# Altium integrated library Samtec 2 mm Pitch Terminal Strips.IntLib: 623 symbols (part 2 of 5)
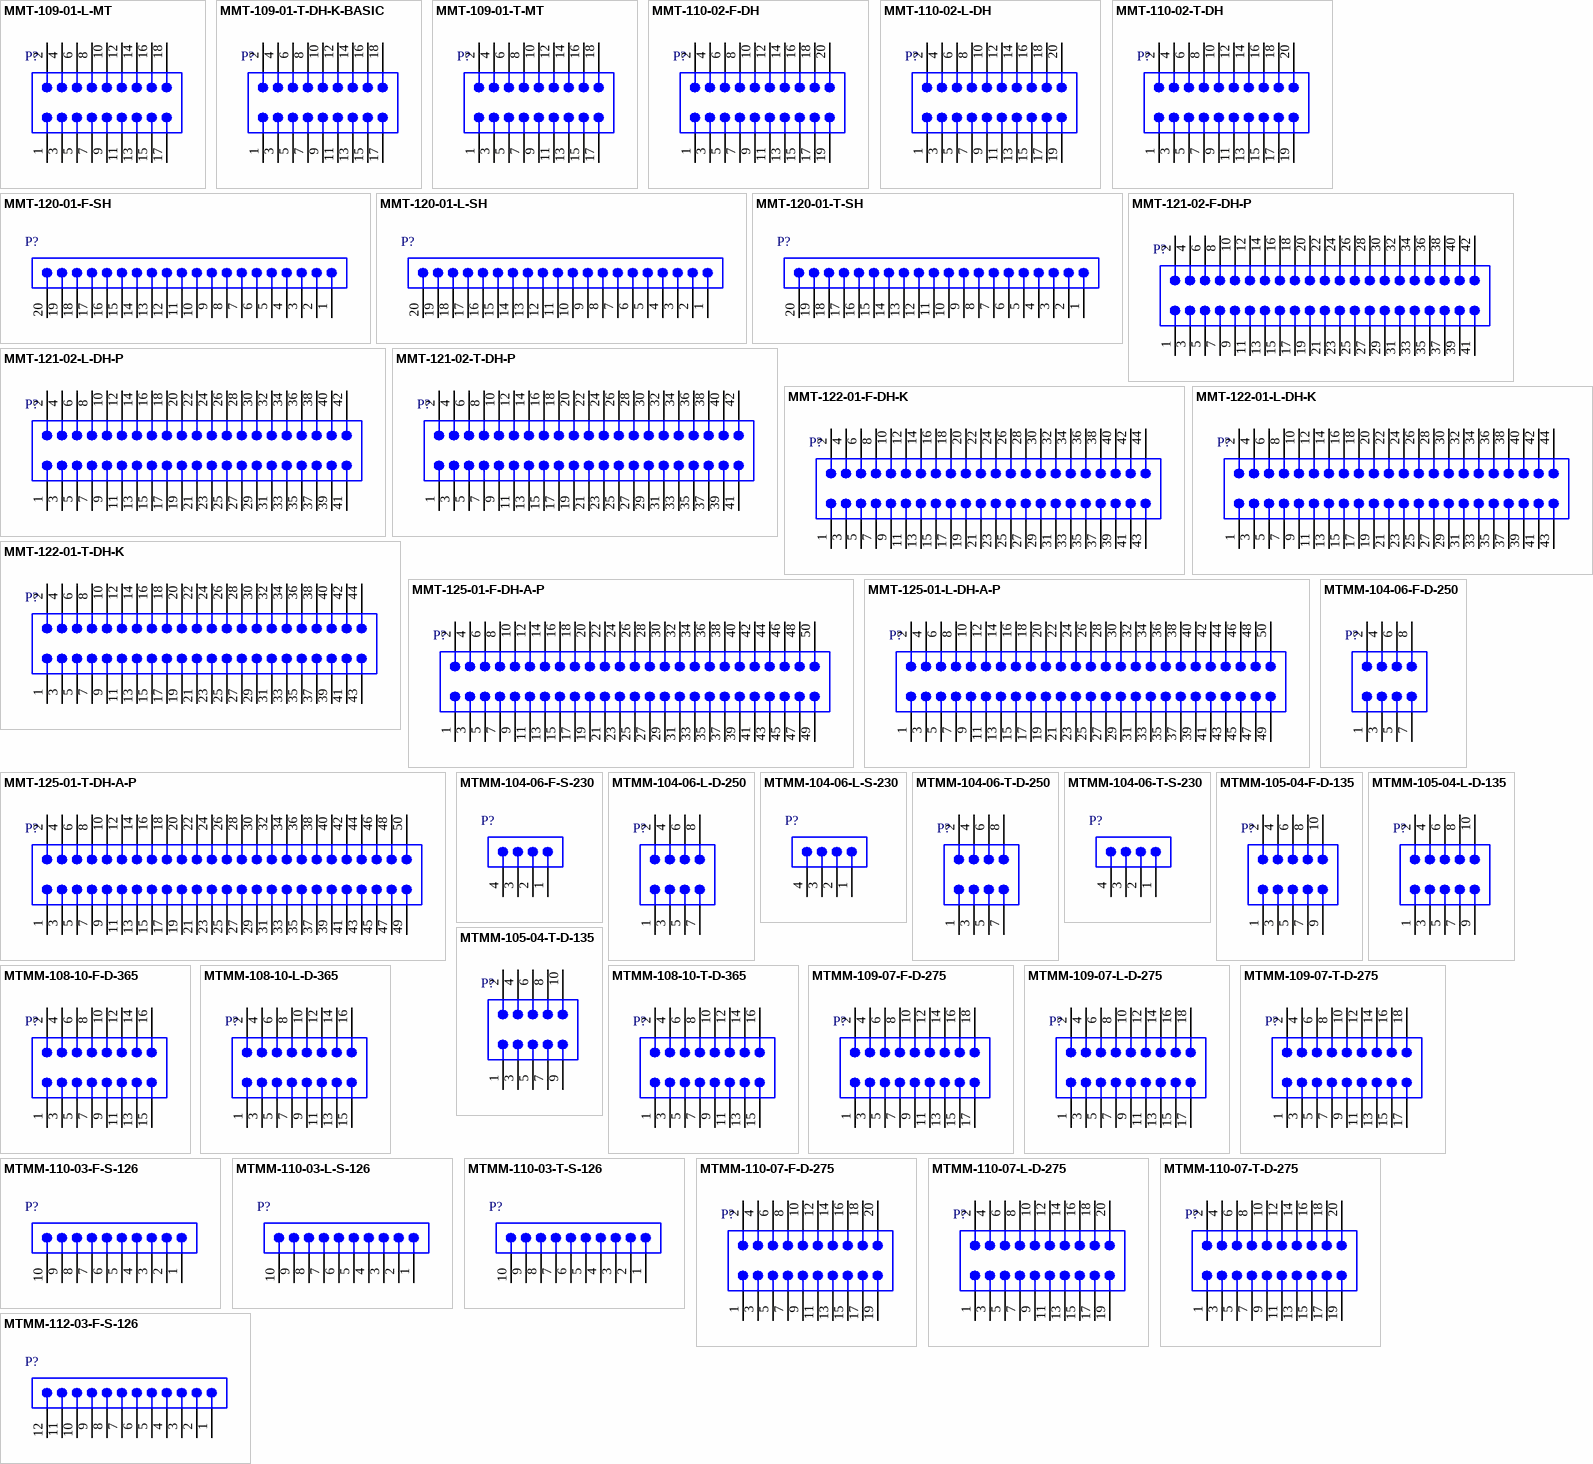
[diagram p18: symbols MMT-109-01-L-MT to MTMM-112-03-F-S-126]

## MMT-125-01-T-DH-A-P
designator P?
Horizontal Surface Mount Header, -55 to 105 degC, 2 mm Pitch, 50-Pin, Male, RoHS; Manufacturer: Samtec; PartNumber: MMT-125-01-T-DH-A-P; Pitch: 2 mm; DatasheetVersion: F-214; PackageVersion: CY, 12/2000; PackageReference: MMT-125-01-X-DH-A-P; PackageDescription: 2mm Horizontal Terminal Surface Mount Strip ASSEM; Orientation: Horizontal; RoHS: True; Temperature Range: -55 to 105 degC; Mounting Technology: Surface Mount; ComponentLink1Description: Manufacturer URL; ComponentLink1URL: http://www.samtec.com; ComponentLink2Description: Datasheet; ComponentLink2URL: http://d2a072wq521u33.cloudfront.net/catalog_english//MMT_SM.PDF; ComponentLink3Description: Package Specification; ComponentLink3URL: http://www.samtec.com/documents/webfiles/cpdf/MMT-1XX-XX-XX-XX-XX-XXX-X-XX-MKT.pdf
footprint SMTC-MMT-125-01-X-DH-A-P (Terminal Surface Mount Strip ASSEM, 2x25 Pins, Horizontal, 2mm Pitch, Male)
pins: 1, 2, 3, 4, 5, 6, 7, 8, 9, 10, 11, 12, 13, 14, 15, 16, 17, 18, 19, 20, 21, 22, 23, 24, 25, 26, 27, 28, 29, 30, 31, 32, 33, 34, 35, 36, 37, 38, 39, 40, 41, 42, 43, 44, 45, 46, 47, 48, 49, 50

## MTMM-104-06-F-D-250
designator P?
Modified Through-Hole Header, Vertical, -55 to 125 degC, 2 mm Pitch, 8-Pin, Male, RoHS; Manufacturer: Samtec; PartNumber: MTMM-104-06-F-D-250; Pitch: 2 mm; DatasheetVersion: F-214; PackageVersion: AE, 12/1993; PackageReference: MTMM-104-06-X-D-250; PackageDescription: 2mm Terminal Strip Assembly; Orientation: Vertical; RoHS: True; Temperature Range: -55 to 125 degC; Mounting Technology: Through-hole; ComponentLink1Description: Manufacturer URL; ComponentLink1URL: http://www.samtec.com; ComponentLink2Description: Datasheet; ComponentLink2URL: http://d2a072wq521u33.cloudfront.net/catalog_english//MTMM_TH.PDF; ComponentLink3Description: Package Specification; ComponentLink3URL: http://www.samtec.com/documents/webfiles/cpdf/MTMM-1XX-XX-XX-X-XXX-XX-XXX-MKT.pdf
footprint SMTC-MTMM-104-06-X-D-250 (Terminal Strip Assembly, 2x4 Pins, Vertical, 2mm Pitch, Male)
pins: 1, 2, 3, 4, 5, 6, 7, 8

## MTMM-104-06-F-S-230
designator P?
Modified Through-Hole Header, Vertical, -55 to 125 degC, 2 mm Pitch, 4-Pin, Male, RoHS; Manufacturer: Samtec; PartNumber: MTMM-104-06-F-S-230; Pitch: 2 mm; DatasheetVersion: F-214; PackageVersion: AE, 12/1993; PackageReference: MTMM-104-06-X-S-230; PackageDescription: 2mm Terminal Strip Assembly; Orientation: Vertical; RoHS: True; Temperature Range: -55 to 125 degC; Mounting Technology: Through-hole; ComponentLink1Description: Manufacturer URL; ComponentLink1URL: http://www.samtec.com; ComponentLink2Description: Datasheet; ComponentLink2URL: http://d2a072wq521u33.cloudfront.net/catalog_english//MTMM_TH.PDF; ComponentLink3Description: Package Specification; ComponentLink3URL: http://www.samtec.com/documents/webfiles/cpdf/MTMM-1XX-XX-XX-X-XXX-XX-XXX-MKT.pdf
footprint SMTC-MTMM-104-06-X-S-230 (Terminal Strip Assembly, 1x4 Pins, Vertical, 2mm Pitch, Male)
pins: 1, 2, 3, 4

## MTMM-104-06-L-D-250
designator P?
Modified Through-Hole Header, Vertical, -55 to 125 degC, 2 mm Pitch, 8-Pin, Male, RoHS; Manufacturer: Samtec; PartNumber: MTMM-104-06-L-D-250; Pitch: 2 mm; DatasheetVersion: F-214; PackageVersion: AE, 12/1993; PackageReference: MTMM-104-06-X-D-250; PackageDescription: 2mm Terminal Strip Assembly; Orientation: Vertical; RoHS: True; Temperature Range: -55 to 125 degC; Mounting Technology: Through-hole; ComponentLink1Description: Manufacturer URL; ComponentLink1URL: http://www.samtec.com; ComponentLink2Description: Datasheet; ComponentLink2URL: http://d2a072wq521u33.cloudfront.net/catalog_english//MTMM_TH.PDF; ComponentLink3Description: Package Specification; ComponentLink3URL: http://www.samtec.com/documents/webfiles/cpdf/MTMM-1XX-XX-XX-X-XXX-XX-XXX-MKT.pdf
footprint SMTC-MTMM-104-06-X-D-250 (Terminal Strip Assembly, 2x4 Pins, Vertical, 2mm Pitch, Male)
pins: 1, 2, 3, 4, 5, 6, 7, 8

## MTMM-104-06-L-S-230
designator P?
Modified Through-Hole Header, Vertical, -55 to 125 degC, 2 mm Pitch, 4-Pin, Male, RoHS; Manufacturer: Samtec; PartNumber: MTMM-104-06-L-S-230; Pitch: 2 mm; DatasheetVersion: F-214; PackageVersion: AE, 12/1993; PackageReference: MTMM-104-06-X-S-230; PackageDescription: 2mm Terminal Strip Assembly; Orientation: Vertical; RoHS: True; Temperature Range: -55 to 125 degC; Mounting Technology: Through-hole; ComponentLink1Description: Manufacturer URL; ComponentLink1URL: http://www.samtec.com; ComponentLink2Description: Datasheet; ComponentLink2URL: http://d2a072wq521u33.cloudfront.net/catalog_english//MTMM_TH.PDF; ComponentLink3Description: Package Specification; ComponentLink3URL: http://www.samtec.com/documents/webfiles/cpdf/MTMM-1XX-XX-XX-X-XXX-XX-XXX-MKT.pdf
footprint SMTC-MTMM-104-06-X-S-230 (Terminal Strip Assembly, 1x4 Pins, Vertical, 2mm Pitch, Male)
pins: 1, 2, 3, 4

## MTMM-104-06-T-D-250
designator P?
Modified Through-Hole Header, Vertical, -55 to 105 degC, 2 mm Pitch, 8-Pin, Male, RoHS; Manufacturer: Samtec; PartNumber: MTMM-104-06-T-D-250; Pitch: 2 mm; DatasheetVersion: F-214; PackageVersion: AE, 12/1993; PackageReference: MTMM-104-06-X-D-250; PackageDescription: 2mm Terminal Strip Assembly; Orientation: Vertical; RoHS: True; Temperature Range: -55 to 105 degC; Mounting Technology: Through-hole; ComponentLink1Description: Manufacturer URL; ComponentLink1URL: http://www.samtec.com; ComponentLink2Description: Datasheet; ComponentLink2URL: http://d2a072wq521u33.cloudfront.net/catalog_english//MTMM_TH.PDF; ComponentLink3Description: Package Specification; ComponentLink3URL: http://www.samtec.com/documents/webfiles/cpdf/MTMM-1XX-XX-XX-X-XXX-XX-XXX-MKT.pdf
footprint SMTC-MTMM-104-06-X-D-250 (Terminal Strip Assembly, 2x4 Pins, Vertical, 2mm Pitch, Male)
pins: 1, 2, 3, 4, 5, 6, 7, 8

## MTMM-104-06-T-S-230
designator P?
Modified Through-Hole Header, Vertical, -55 to 105 degC, 2 mm Pitch, 4-Pin, Male, RoHS; Manufacturer: Samtec; PartNumber: MTMM-104-06-T-S-230; Pitch: 2 mm; DatasheetVersion: F-214; PackageVersion: AE, 12/1993; PackageReference: MTMM-104-06-X-S-230; PackageDescription: 2mm Terminal Strip Assembly; Orientation: Vertical; RoHS: True; Temperature Range: -55 to 105 degC; Mounting Technology: Through-hole; ComponentLink1Description: Manufacturer URL; ComponentLink1URL: http://www.samtec.com; ComponentLink2Description: Datasheet; ComponentLink2URL: http://d2a072wq521u33.cloudfront.net/catalog_english//MTMM_TH.PDF; ComponentLink3Description: Package Specification; ComponentLink3URL: http://www.samtec.com/documents/webfiles/cpdf/MTMM-1XX-XX-XX-X-XXX-XX-XXX-MKT.pdf
footprint SMTC-MTMM-104-06-X-S-230 (Terminal Strip Assembly, 1x4 Pins, Vertical, 2mm Pitch, Male)
pins: 1, 2, 3, 4

## MTMM-105-04-F-D-135
designator P?
Modified Through-Hole Header, Vertical, -55 to 125 degC, 2 mm Pitch, 10-Pin, Male, RoHS; Manufacturer: Samtec; PartNumber: MTMM-105-04-F-D-135; Pitch: 2 mm; DatasheetVersion: F-214; PackageVersion: AE, 12/1993; PackageReference: MTMM-105-04-X-D-135; PackageDescription: 2mm Terminal Strip Assembly; Orientation: Vertical; RoHS: True; Temperature Range: -55 to 125 degC; Mounting Technology: Through-hole; ComponentLink1Description: Manufacturer URL; ComponentLink1URL: http://www.samtec.com; ComponentLink2Description: Datasheet; ComponentLink2URL: http://d2a072wq521u33.cloudfront.net/catalog_english//MTMM_TH.PDF; ComponentLink3Description: Package Specification; ComponentLink3URL: http://www.samtec.com/documents/webfiles/cpdf/MTMM-1XX-XX-XX-X-XXX-XX-XXX-MKT.pdf
footprint SMTC-MTMM-105-04-X-D-135 (Terminal Strip Assembly, 2x5 Pins, Vertical, 2mm Pitch, Male)
pins: 1, 2, 3, 4, 5, 6, 7, 8, 9, 10

## MTMM-105-04-L-D-135
designator P?
Modified Through-Hole Header, Vertical, -55 to 125 degC, 2 mm Pitch, 10-Pin, Male, RoHS; Manufacturer: Samtec; PartNumber: MTMM-105-04-L-D-135; Pitch: 2 mm; DatasheetVersion: F-214; PackageVersion: AE, 12/1993; PackageReference: MTMM-105-04-X-D-135; PackageDescription: 2mm Terminal Strip Assembly; Orientation: Vertical; RoHS: True; Temperature Range: -55 to 125 degC; Mounting Technology: Through-hole; ComponentLink1Description: Manufacturer URL; ComponentLink1URL: http://www.samtec.com; ComponentLink2Description: Datasheet; ComponentLink2URL: http://d2a072wq521u33.cloudfront.net/catalog_english//MTMM_TH.PDF; ComponentLink3Description: Package Specification; ComponentLink3URL: http://www.samtec.com/documents/webfiles/cpdf/MTMM-1XX-XX-XX-X-XXX-XX-XXX-MKT.pdf
footprint SMTC-MTMM-105-04-X-D-135 (Terminal Strip Assembly, 2x5 Pins, Vertical, 2mm Pitch, Male)
pins: 1, 2, 3, 4, 5, 6, 7, 8, 9, 10

## MTMM-105-04-T-D-135
designator P?
Modified Through-Hole Header, Vertical, -55 to 105 degC, 2 mm Pitch, 10-Pin, Male, RoHS; Manufacturer: Samtec; PartNumber: MTMM-105-04-T-D-135; Pitch: 2 mm; DatasheetVersion: F-214; PackageVersion: AE, 12/1993; PackageReference: MTMM-105-04-X-D-135; PackageDescription: 2mm Terminal Strip Assembly; Orientation: Vertical; RoHS: True; Temperature Range: -55 to 105 degC; Mounting Technology: Through-hole; ComponentLink1Description: Manufacturer URL; ComponentLink1URL: http://www.samtec.com; ComponentLink2Description: Datasheet; ComponentLink2URL: http://d2a072wq521u33.cloudfront.net/catalog_english//MTMM_TH.PDF; ComponentLink3Description: Package Specification; ComponentLink3URL: http://www.samtec.com/documents/webfiles/cpdf/MTMM-1XX-XX-XX-X-XXX-XX-XXX-MKT.pdf
footprint SMTC-MTMM-105-04-X-D-135 (Terminal Strip Assembly, 2x5 Pins, Vertical, 2mm Pitch, Male)
pins: 1, 2, 3, 4, 5, 6, 7, 8, 9, 10

## MTMM-108-10-F-D-365
designator P?
Modified Through-Hole Header, Vertical, -55 to 125 degC, 2 mm Pitch, 16-Pin, Male, RoHS; Manufacturer: Samtec; PartNumber: MTMM-108-10-F-D-365; Pitch: 2 mm; DatasheetVersion: F-214; PackageVersion: AE, 12/1993; PackageReference: MTMM-108-10-X-D-365; PackageDescription: 2mm Terminal Strip Assembly; Orientation: Vertical; RoHS: True; Temperature Range: -55 to 125 degC; Mounting Technology: Through-hole; ComponentLink1Description: Manufacturer URL; ComponentLink1URL: http://www.samtec.com; ComponentLink2Description: Datasheet; ComponentLink2URL: http://d2a072wq521u33.cloudfront.net/catalog_english//MTMM_TH.PDF; ComponentLink3Description: Package Specification; ComponentLink3URL: http://www.samtec.com/documents/webfiles/cpdf/MTMM-1XX-XX-XX-X-XXX-XX-XXX-MKT.pdf
footprint SMTC-MTMM-108-10-X-D-365 (Terminal Strip Assembly, 2x8 Pins, Vertical, 2mm Pitch, Male)
pins: 1, 2, 3, 4, 5, 6, 7, 8, 9, 10, 11, 12, 13, 14, 15, 16

## MTMM-108-10-L-D-365
designator P?
Modified Through-Hole Header, Vertical, -55 to 125 degC, 2 mm Pitch, 16-Pin, Male, RoHS; Manufacturer: Samtec; PartNumber: MTMM-108-10-L-D-365; Pitch: 2 mm; DatasheetVersion: F-214; PackageVersion: AE, 12/1993; PackageReference: MTMM-108-10-X-D-365; PackageDescription: 2mm Terminal Strip Assembly; Orientation: Vertical; RoHS: True; Temperature Range: -55 to 125 degC; Mounting Technology: Through-hole; ComponentLink1Description: Manufacturer URL; ComponentLink1URL: http://www.samtec.com; ComponentLink2Description: Datasheet; ComponentLink2URL: http://d2a072wq521u33.cloudfront.net/catalog_english//MTMM_TH.PDF; ComponentLink3Description: Package Specification; ComponentLink3URL: http://www.samtec.com/documents/webfiles/cpdf/MTMM-1XX-XX-XX-X-XXX-XX-XXX-MKT.pdf
footprint SMTC-MTMM-108-10-X-D-365 (Terminal Strip Assembly, 2x8 Pins, Vertical, 2mm Pitch, Male)
pins: 1, 2, 3, 4, 5, 6, 7, 8, 9, 10, 11, 12, 13, 14, 15, 16

## MTMM-108-10-T-D-365
designator P?
Modified Through-Hole Header, Vertical, -55 to 105 degC, 2 mm Pitch, 16-Pin, Male, RoHS; Manufacturer: Samtec; PartNumber: MTMM-108-10-T-D-365; Pitch: 2 mm; DatasheetVersion: F-214; PackageVersion: AE, 12/1993; PackageReference: MTMM-108-10-X-D-365; PackageDescription: 2mm Terminal Strip Assembly; Orientation: Vertical; RoHS: True; Temperature Range: -55 to 105 degC; Mounting Technology: Through-hole; ComponentLink1Description: Manufacturer URL; ComponentLink1URL: http://www.samtec.com; ComponentLink2Description: Datasheet; ComponentLink2URL: http://d2a072wq521u33.cloudfront.net/catalog_english//MTMM_TH.PDF; ComponentLink3Description: Package Specification; ComponentLink3URL: http://www.samtec.com/documents/webfiles/cpdf/MTMM-1XX-XX-XX-X-XXX-XX-XXX-MKT.pdf
footprint SMTC-MTMM-108-10-X-D-365 (Terminal Strip Assembly, 2x8 Pins, Vertical, 2mm Pitch, Male)
pins: 1, 2, 3, 4, 5, 6, 7, 8, 9, 10, 11, 12, 13, 14, 15, 16

## MTMM-109-07-F-D-275
designator P?
Modified Through-Hole Header, Vertical, -55 to 125 degC, 2 mm Pitch, 18-Pin, Male, RoHS; Manufacturer: Samtec; PartNumber: MTMM-109-07-F-D-275; Pitch: 2 mm; DatasheetVersion: F-214; PackageVersion: AE, 12/1993; PackageReference: MTMM-109-07-X-D-275; PackageDescription: 2mm Terminal Strip Assembly; Orientation: Vertical; RoHS: True; Temperature Range: -55 to 125 degC; Mounting Technology: Through-hole; ComponentLink1Description: Manufacturer URL; ComponentLink1URL: http://www.samtec.com; ComponentLink2Description: Datasheet; ComponentLink2URL: http://d2a072wq521u33.cloudfront.net/catalog_english//MTMM_TH.PDF; ComponentLink3Description: Package Specification; ComponentLink3URL: http://www.samtec.com/documents/webfiles/cpdf/MTMM-1XX-XX-XX-X-XXX-XX-XXX-MKT.pdf
footprint SMTC-MTMM-109-07-X-D-275 (Terminal Strip Assembly, 2x9 Pins, Vertical, 2mm Pitch, Male)
pins: 1, 2, 3, 4, 5, 6, 7, 8, 9, 10, 11, 12, 13, 14, 15, 16, 17, 18

## MTMM-109-07-L-D-275
designator P?
Modified Through-Hole Header, Vertical, -55 to 125 degC, 2 mm Pitch, 18-Pin, Male, RoHS; Manufacturer: Samtec; PartNumber: MTMM-109-07-L-D-275; Pitch: 2 mm; DatasheetVersion: F-214; PackageVersion: AE, 12/1993; PackageReference: MTMM-109-07-X-D-275; PackageDescription: 2mm Terminal Strip Assembly; Orientation: Vertical; RoHS: True; Temperature Range: -55 to 125 degC; Mounting Technology: Through-hole; ComponentLink1Description: Manufacturer URL; ComponentLink1URL: http://www.samtec.com; ComponentLink2Description: Datasheet; ComponentLink2URL: http://d2a072wq521u33.cloudfront.net/catalog_english//MTMM_TH.PDF; ComponentLink3Description: Package Specification; ComponentLink3URL: http://www.samtec.com/documents/webfiles/cpdf/MTMM-1XX-XX-XX-X-XXX-XX-XXX-MKT.pdf
footprint SMTC-MTMM-109-07-X-D-275 (Terminal Strip Assembly, 2x9 Pins, Vertical, 2mm Pitch, Male)
pins: 1, 2, 3, 4, 5, 6, 7, 8, 9, 10, 11, 12, 13, 14, 15, 16, 17, 18

## MTMM-109-07-T-D-275
designator P?
Modified Through-Hole Header, Vertical, -55 to 105 degC, 2 mm Pitch, 18-Pin, Male, RoHS; Manufacturer: Samtec; PartNumber: MTMM-109-07-T-D-275; Pitch: 2 mm; DatasheetVersion: F-214; PackageVersion: AE, 12/1993; PackageReference: MTMM-109-07-X-D-275; PackageDescription: 2mm Terminal Strip Assembly; Orientation: Vertical; RoHS: True; Temperature Range: -55 to 105 degC; Mounting Technology: Through-hole; ComponentLink1Description: Manufacturer URL; ComponentLink1URL: http://www.samtec.com; ComponentLink2Description: Datasheet; ComponentLink2URL: http://d2a072wq521u33.cloudfront.net/catalog_english//MTMM_TH.PDF; ComponentLink3Description: Package Specification; ComponentLink3URL: http://www.samtec.com/documents/webfiles/cpdf/MTMM-1XX-XX-XX-X-XXX-XX-XXX-MKT.pdf
footprint SMTC-MTMM-109-07-X-D-275 (Terminal Strip Assembly, 2x9 Pins, Vertical, 2mm Pitch, Male)
pins: 1, 2, 3, 4, 5, 6, 7, 8, 9, 10, 11, 12, 13, 14, 15, 16, 17, 18

## MTMM-110-03-F-S-126
designator P?
Modified Through-Hole Header, Vertical, -55 to 125 degC, 2 mm Pitch, 10-Pin, Male, RoHS; Manufacturer: Samtec; PartNumber: MTMM-110-03-F-S-126; Pitch: 2 mm; DatasheetVersion: F-214; PackageVersion: AE, 12/1993; PackageReference: MTMM-110-03-X-S-126; PackageDescription: 2mm Terminal Strip Assembly; Orientation: Vertical; RoHS: True; Temperature Range: -55 to 125 degC; Mounting Technology: Through-hole; ComponentLink1Description: Manufacturer URL; ComponentLink1URL: http://www.samtec.com; ComponentLink2Description: Datasheet; ComponentLink2URL: http://d2a072wq521u33.cloudfront.net/catalog_english//MTMM_TH.PDF; ComponentLink3Description: Package Specification; ComponentLink3URL: http://www.samtec.com/documents/webfiles/cpdf/MTMM-1XX-XX-XX-X-XXX-XX-XXX-MKT.pdf
footprint SMTC-MTMM-110-03-X-S-126 (Terminal Strip Assembly, 1x10 Pins, Vertical, 2mm Pitch, Male)
pins: 1, 2, 3, 4, 5, 6, 7, 8, 9, 10

## MTMM-110-03-L-S-126
designator P?
Modified Through-Hole Header, Vertical, -55 to 125 degC, 2 mm Pitch, 10-Pin, Male, RoHS; Manufacturer: Samtec; PartNumber: MTMM-110-03-L-S-126; Pitch: 2 mm; DatasheetVersion: F-214; PackageVersion: AE, 12/1993; PackageReference: MTMM-110-03-X-S-126; PackageDescription: 2mm Terminal Strip Assembly; Orientation: Vertical; RoHS: True; Temperature Range: -55 to 125 degC; Mounting Technology: Through-hole; ComponentLink1Description: Manufacturer URL; ComponentLink1URL: http://www.samtec.com; ComponentLink2Description: Datasheet; ComponentLink2URL: http://d2a072wq521u33.cloudfront.net/catalog_english//MTMM_TH.PDF; ComponentLink3Description: Package Specification; ComponentLink3URL: http://www.samtec.com/documents/webfiles/cpdf/MTMM-1XX-XX-XX-X-XXX-XX-XXX-MKT.pdf
footprint SMTC-MTMM-110-03-X-S-126 (Terminal Strip Assembly, 1x10 Pins, Vertical, 2mm Pitch, Male)
pins: 1, 2, 3, 4, 5, 6, 7, 8, 9, 10

## MTMM-110-03-T-S-126
designator P?
Modified Through-Hole Header, Vertical, -55 to 105 degC, 2 mm Pitch, 10-Pin, Male, RoHS; Manufacturer: Samtec; PartNumber: MTMM-110-03-T-S-126; Pitch: 2 mm; DatasheetVersion: F-214; PackageVersion: AE, 12/1993; PackageReference: MTMM-110-03-X-S-126; PackageDescription: 2mm Terminal Strip Assembly; Orientation: Vertical; RoHS: True; Temperature Range: -55 to 105 degC; Mounting Technology: Through-hole; ComponentLink1Description: Manufacturer URL; ComponentLink1URL: http://www.samtec.com; ComponentLink2Description: Datasheet; ComponentLink2URL: http://d2a072wq521u33.cloudfront.net/catalog_english//MTMM_TH.PDF; ComponentLink3Description: Package Specification; ComponentLink3URL: http://www.samtec.com/documents/webfiles/cpdf/MTMM-1XX-XX-XX-X-XXX-XX-XXX-MKT.pdf
footprint SMTC-MTMM-110-03-X-S-126 (Terminal Strip Assembly, 1x10 Pins, Vertical, 2mm Pitch, Male)
pins: 1, 2, 3, 4, 5, 6, 7, 8, 9, 10

## MTMM-110-07-F-D-275
designator P?
Modified Through-Hole Header, Vertical, -55 to 125 degC, 2 mm Pitch, 20-Pin, Male, RoHS; Manufacturer: Samtec; PartNumber: MTMM-110-07-F-D-275; Pitch: 2 mm; DatasheetVersion: F-214; PackageVersion: AE, 12/1993; PackageReference: MTMM-110-07-X-D-275; PackageDescription: 2mm Terminal Strip Assembly; Orientation: Vertical; RoHS: True; Temperature Range: -55 to 125 degC; Mounting Technology: Through-hole; ComponentLink1Description: Manufacturer URL; ComponentLink1URL: http://www.samtec.com; ComponentLink2Description: Datasheet; ComponentLink2URL: http://d2a072wq521u33.cloudfront.net/catalog_english//MTMM_TH.PDF; ComponentLink3Description: Package Specification; ComponentLink3URL: http://www.samtec.com/documents/webfiles/cpdf/MTMM-1XX-XX-XX-X-XXX-XX-XXX-MKT.pdf
footprint SMTC-MTMM-110-07-X-D-275 (Terminal Strip Assembly, 2x10 Pins, Vertical, 2mm Pitch, Male)
pins: 1, 2, 3, 4, 5, 6, 7, 8, 9, 10, 11, 12, 13, 14, 15, 16, 17, 18, 19, 20

## MTMM-110-07-L-D-275
designator P?
Modified Through-Hole Header, Vertical, -55 to 125 degC, 2 mm Pitch, 20-Pin, Male, RoHS; Manufacturer: Samtec; PartNumber: MTMM-110-07-L-D-275; Pitch: 2 mm; DatasheetVersion: F-214; PackageVersion: AE, 12/1993; PackageReference: MTMM-110-07-X-D-275; PackageDescription: 2mm Terminal Strip Assembly; Orientation: Vertical; RoHS: True; Temperature Range: -55 to 125 degC; Mounting Technology: Through-hole; ComponentLink1Description: Manufacturer URL; ComponentLink1URL: http://www.samtec.com; ComponentLink2Description: Datasheet; ComponentLink2URL: http://d2a072wq521u33.cloudfront.net/catalog_english//MTMM_TH.PDF; ComponentLink3Description: Package Specification; ComponentLink3URL: http://www.samtec.com/documents/webfiles/cpdf/MTMM-1XX-XX-XX-X-XXX-XX-XXX-MKT.pdf
footprint SMTC-MTMM-110-07-X-D-275 (Terminal Strip Assembly, 2x10 Pins, Vertical, 2mm Pitch, Male)
pins: 1, 2, 3, 4, 5, 6, 7, 8, 9, 10, 11, 12, 13, 14, 15, 16, 17, 18, 19, 20

## MTMM-110-07-T-D-275
designator P?
Modified Through-Hole Header, Vertical, -55 to 105 degC, 2 mm Pitch, 20-Pin, Male, RoHS; Manufacturer: Samtec; PartNumber: MTMM-110-07-T-D-275; Pitch: 2 mm; DatasheetVersion: F-214; PackageVersion: AE, 12/1993; PackageReference: MTMM-110-07-X-D-275; PackageDescription: 2mm Terminal Strip Assembly; Orientation: Vertical; RoHS: True; Temperature Range: -55 to 105 degC; Mounting Technology: Through-hole; ComponentLink1Description: Manufacturer URL; ComponentLink1URL: http://www.samtec.com; ComponentLink2Description: Datasheet; ComponentLink2URL: http://d2a072wq521u33.cloudfront.net/catalog_english//MTMM_TH.PDF; ComponentLink3Description: Package Specification; ComponentLink3URL: http://www.samtec.com/documents/webfiles/cpdf/MTMM-1XX-XX-XX-X-XXX-XX-XXX-MKT.pdf
footprint SMTC-MTMM-110-07-X-D-275 (Terminal Strip Assembly, 2x10 Pins, Vertical, 2mm Pitch, Male)
pins: 1, 2, 3, 4, 5, 6, 7, 8, 9, 10, 11, 12, 13, 14, 15, 16, 17, 18, 19, 20

## MTMM-112-03-F-S-126
designator P?
Modified Through-Hole Header, Vertical, -55 to 125 degC, 2 mm Pitch, 12-Pin, Male, RoHS; Manufacturer: Samtec; PartNumber: MTMM-112-03-F-S-126; Pitch: 2 mm; DatasheetVersion: F-214; PackageVersion: AE, 12/1993; PackageReference: MTMM-112-03-X-S-126; PackageDescription: 2mm Terminal Strip Assembly; Orientation: Vertical; RoHS: True; Temperature Range: -55 to 125 degC; Mounting Technology: Through-hole; ComponentLink1Description: Manufacturer URL; ComponentLink1URL: http://www.samtec.com; ComponentLink2Description: Datasheet; ComponentLink2URL: http://d2a072wq521u33.cloudfront.net/catalog_english//MTMM_TH.PDF; ComponentLink3Description: Package Specification; ComponentLink3URL: http://www.samtec.com/documents/webfiles/cpdf/MTMM-1XX-XX-XX-X-XXX-XX-XXX-MKT.pdf
footprint SMTC-MTMM-112-03-X-S-126 (Terminal Strip Assembly, 1x12 Pins, Vertical, 2mm Pitch, Male)
pins: 1, 2, 3, 4, 5, 6, 7, 8, 9, 10, 11, 12

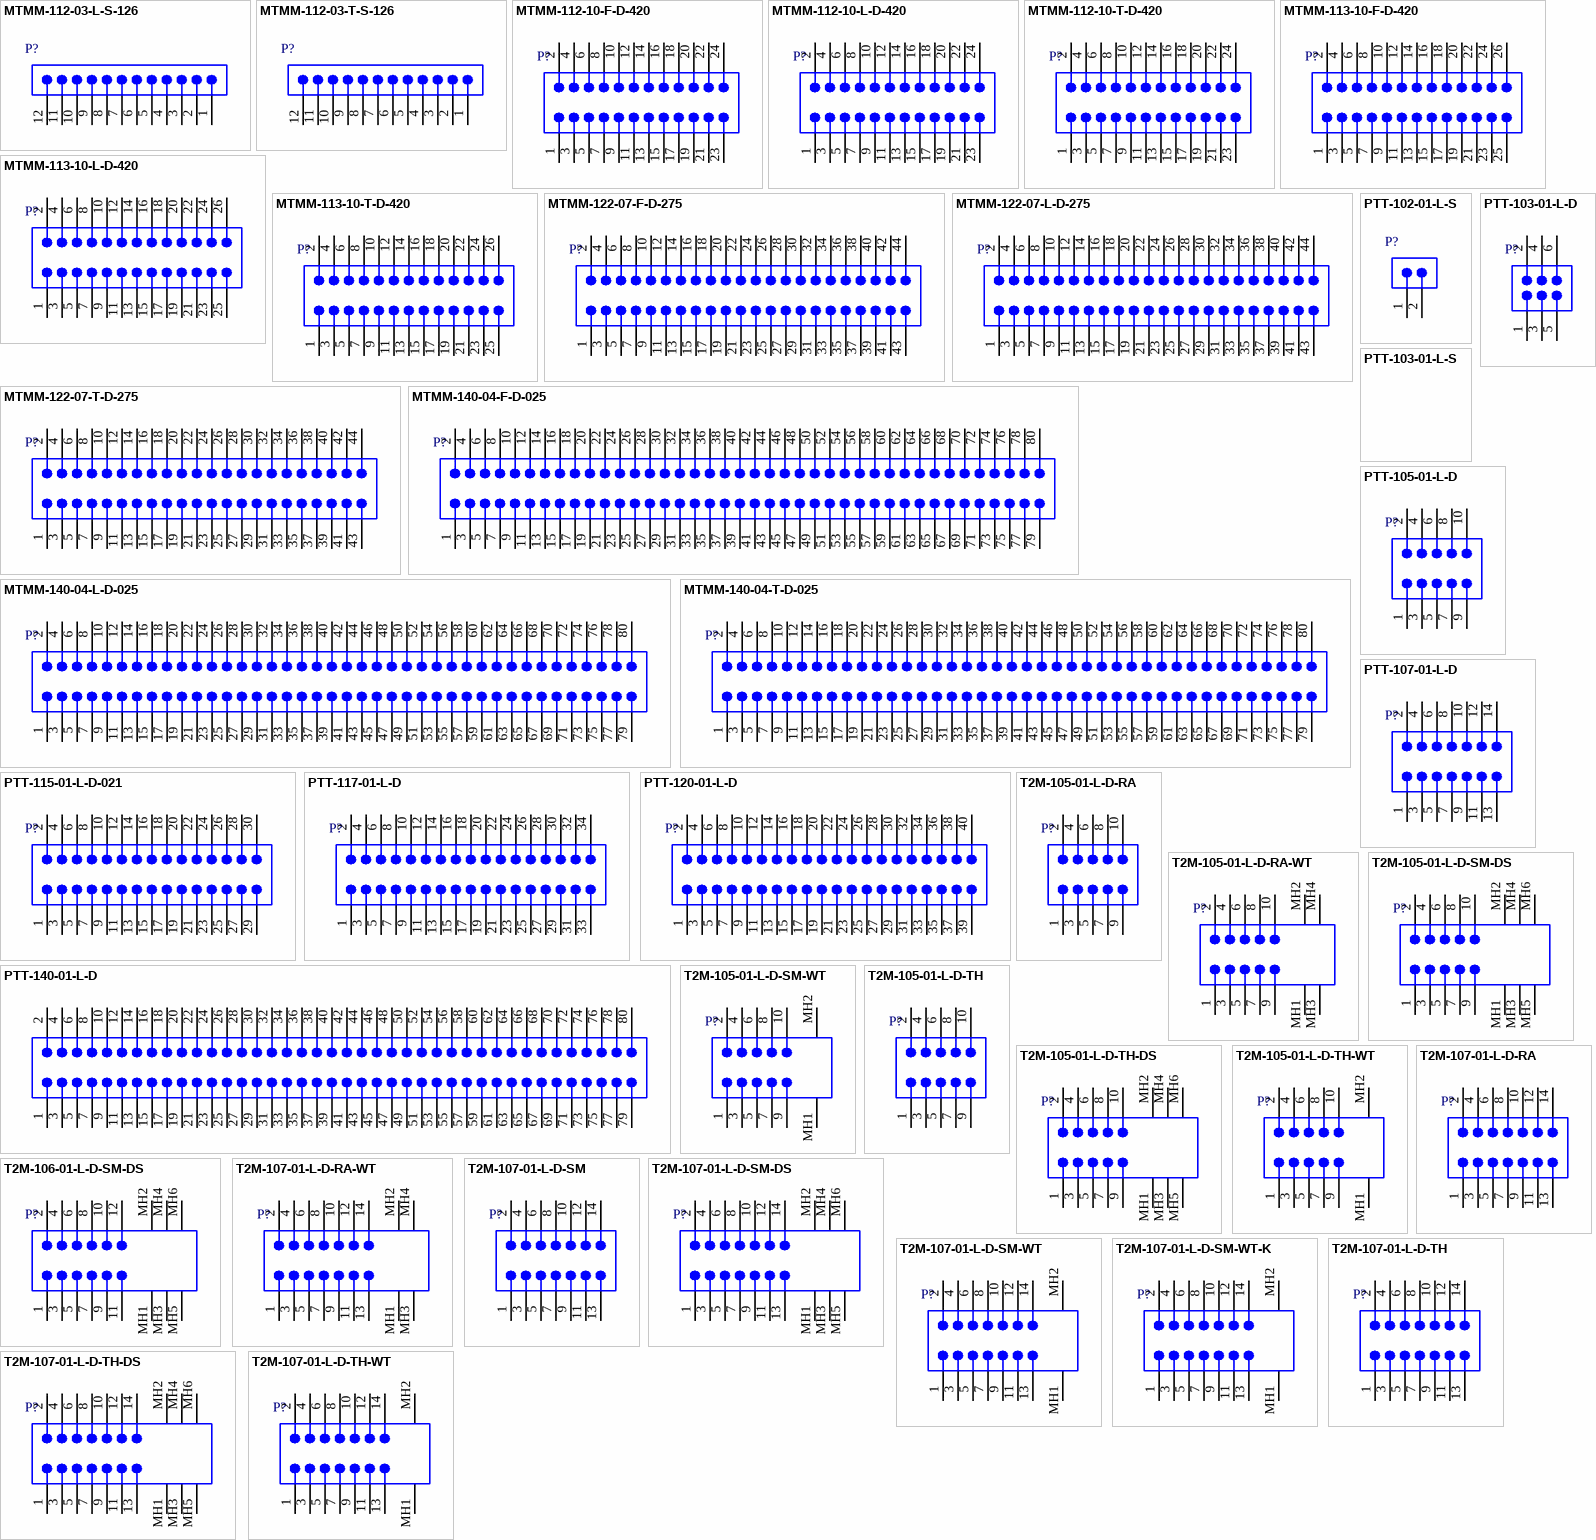
[diagram p4: symbols MTMM-112-03-L-S-126 to T2M-107-01-L-D-TH-WT]

## MTMM-112-03-L-S-126
designator P?
Modified Through-Hole Header, Vertical, -55 to 125 degC, 2 mm Pitch, 12-Pin, Male, RoHS; Manufacturer: Samtec; PartNumber: MTMM-112-03-L-S-126; Pitch: 2 mm; DatasheetVersion: F-214; PackageVersion: AE, 12/1993; PackageReference: MTMM-112-03-X-S-126; PackageDescription: 2mm Terminal Strip Assembly; Orientation: Vertical; RoHS: True; Temperature Range: -55 to 125 degC; Mounting Technology: Through-hole; ComponentLink1Description: Manufacturer URL; ComponentLink1URL: http://www.samtec.com; ComponentLink2Description: Datasheet; ComponentLink2URL: http://d2a072wq521u33.cloudfront.net/catalog_english//MTMM_TH.PDF; ComponentLink3Description: Package Specification; ComponentLink3URL: http://www.samtec.com/documents/webfiles/cpdf/MTMM-1XX-XX-XX-X-XXX-XX-XXX-MKT.pdf
footprint SMTC-MTMM-112-03-X-S-126 (Terminal Strip Assembly, 1x12 Pins, Vertical, 2mm Pitch, Male)
pins: 1, 2, 3, 4, 5, 6, 7, 8, 9, 10, 11, 12

## MTMM-112-03-T-S-126
designator P?
Modified Through-Hole Header, Vertical, -55 to 105 degC, 2 mm Pitch, 12-Pin, Male, RoHS; Manufacturer: Samtec; PartNumber: MTMM-112-03-T-S-126; Pitch: 2 mm; DatasheetVersion: F-214; PackageVersion: AE, 12/1993; PackageReference: MTMM-112-03-X-S-126; PackageDescription: 2mm Terminal Strip Assembly; Orientation: Vertical; RoHS: True; Temperature Range: -55 to 105 degC; Mounting Technology: Through-hole; ComponentLink1Description: Manufacturer URL; ComponentLink1URL: http://www.samtec.com; ComponentLink2Description: Datasheet; ComponentLink2URL: http://d2a072wq521u33.cloudfront.net/catalog_english//MTMM_TH.PDF; ComponentLink3Description: Package Specification; ComponentLink3URL: http://www.samtec.com/documents/webfiles/cpdf/MTMM-1XX-XX-XX-X-XXX-XX-XXX-MKT.pdf
footprint SMTC-MTMM-112-03-X-S-126 (Terminal Strip Assembly, 1x12 Pins, Vertical, 2mm Pitch, Male)
pins: 1, 2, 3, 4, 5, 6, 7, 8, 9, 10, 11, 12

## MTMM-112-10-F-D-420
designator P?
Modified Through-Hole Header, Vertical, -55 to 125 degC, 2 mm Pitch, 24-Pin, Male, RoHS; Manufacturer: Samtec; PartNumber: MTMM-112-10-F-D-420; Pitch: 2 mm; DatasheetVersion: F-214; PackageVersion: AE, 12/1993; PackageReference: MTMM-112-10-X-D-420; PackageDescription: 2mm Terminal Strip Assembly; Orientation: Vertical; RoHS: True; Temperature Range: -55 to 125 degC; Mounting Technology: Through-hole; ComponentLink1Description: Manufacturer URL; ComponentLink1URL: http://www.samtec.com; ComponentLink2Description: Datasheet; ComponentLink2URL: http://d2a072wq521u33.cloudfront.net/catalog_english//MTMM_TH.PDF; ComponentLink3Description: Package Specification; ComponentLink3URL: http://www.samtec.com/documents/webfiles/cpdf/MTMM-1XX-XX-XX-X-XXX-XX-XXX-MKT.pdf
footprint SMTC-MTMM-112-10-X-D-420 (Terminal Strip Assembly, 2x12 Pins, Vertical, 2mm Pitch, Male)
pins: 1, 2, 3, 4, 5, 6, 7, 8, 9, 10, 11, 12, 13, 14, 15, 16, 17, 18, 19, 20, 21, 22, 23, 24
